# Altium footprint library 1.01-电阻.PcbLib: 78 footprints (part 4 of 5)
Each footprint in its own frame and in the unit in brackets; x right, y up, seen from the top. Pads: shape width x height; smd on the part's side, far side on the other; paste and mask are expansions set on the pad; w line width, h text height; cw(c..) or ccw(c..) is an arc to the next point about the centre after c.
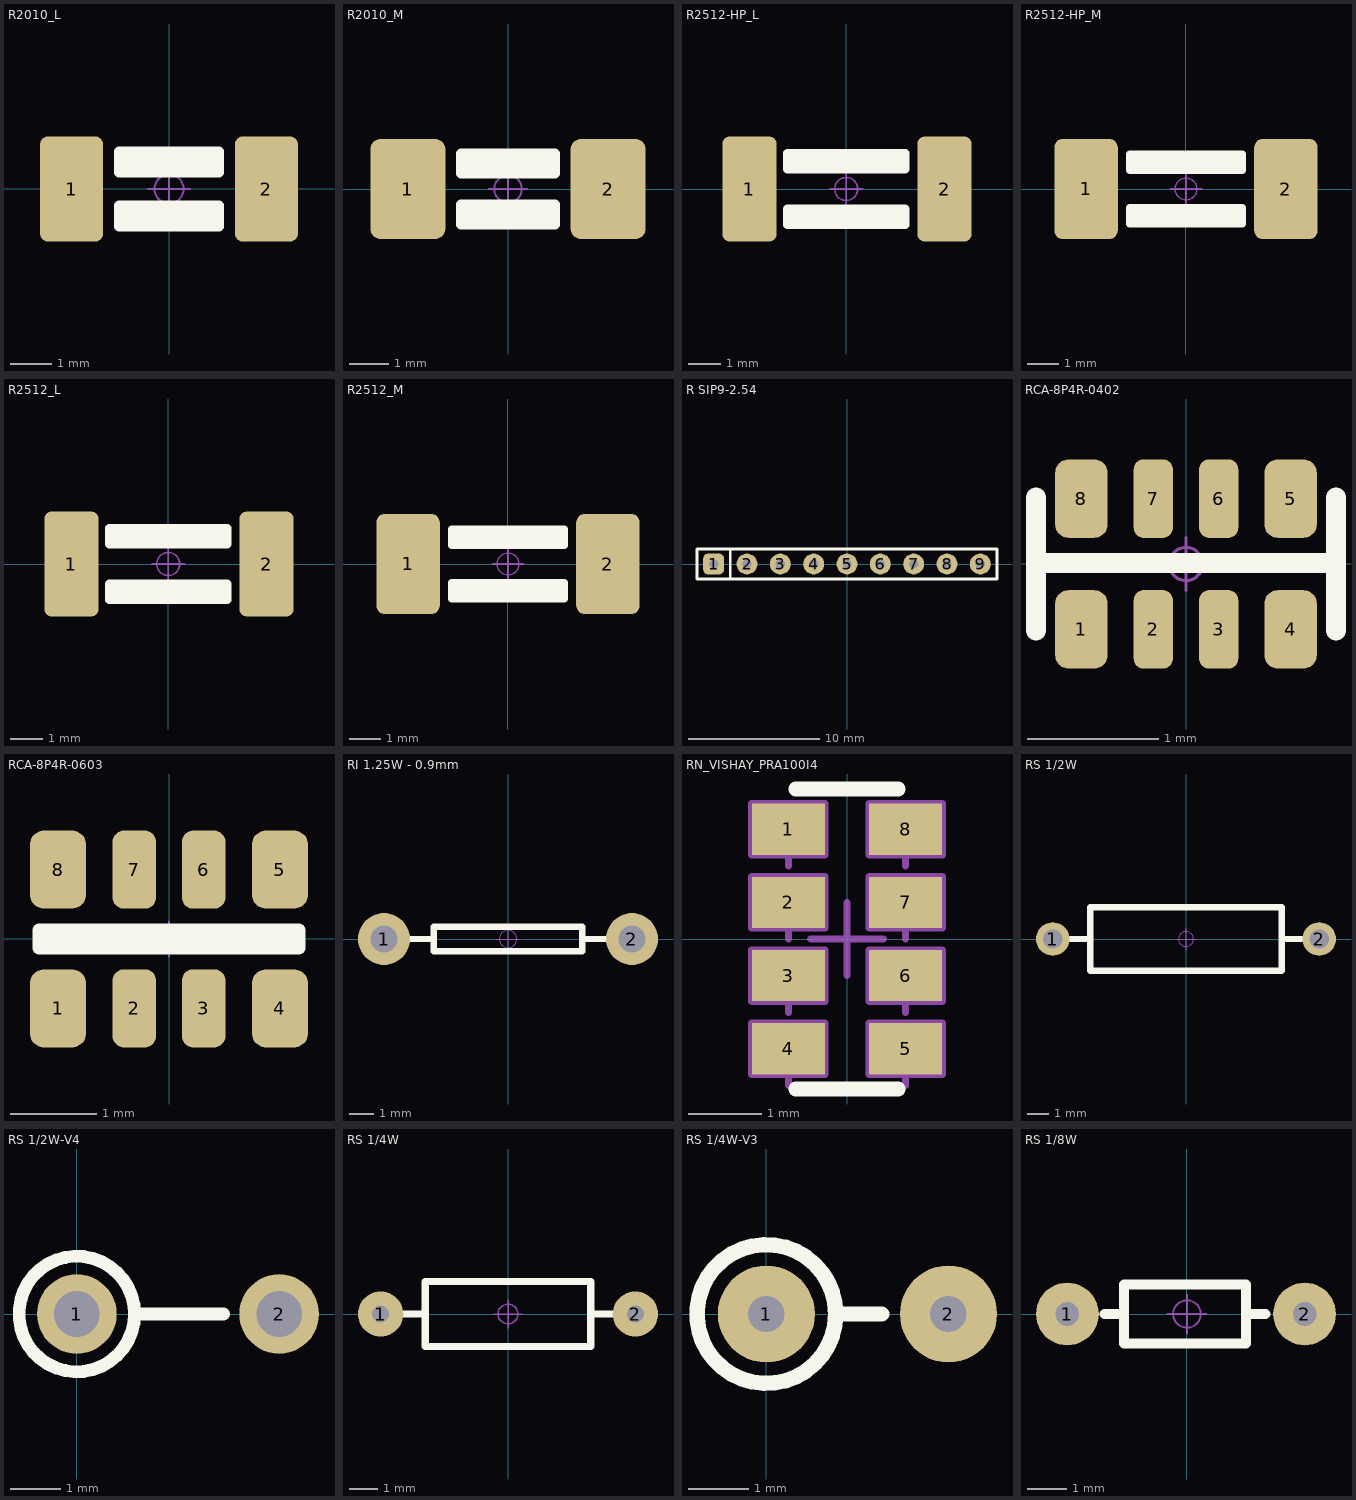
[diagram p3: the footprints below, top view; thin cyan lines are the x and y axes]

## R2010_L [mm] "3/4W贴片电阻                  淘宝ID:黄晶宝石"
pads (2):
  rrect25% 1.52x2.54 smd: 1(-2.35,0) 2(2.35,0)
Top Overlay:
  region: 1.2,-0.4 -1.2,-0.4 -1.2,-0.9 1.2,-0.9
  region: -1.2,0.4 1.2,0.4 1.2,0.9 -1.2,0.9
  lines w0.254: -1.2,-0.9 -1.2,-0.4 1.2,-0.4 1.2,-0.9 -0.7,-0.9 -1.2,-0.9 ; -1.2,0.4 -1.2,0.9 0.7,0.9 1.2,0.9 1.2,0.4 -1.2,0.4
Mechanical 15:
  circle w0.05: c0,0 r0.35
  lines w0.05: -0.5,0 0.5,0 ; 0,-0.5 0,0.5
3D body "R2010.STEP": height 0.58, standoff 0.03, extent -2.5,-1.25 2.5,1.25

## R2010_M [mm] "3/4W贴片电阻                 淘宝ID:黄晶宝石"
pads (2):
  rrect25% 1.905x2.54 smd: 1(-2.55,0) 2(2.55,0)
Top Overlay:
  region: 1.2,-0.4 -1.2,-0.4 -1.2,-0.9 1.2,-0.9
  region: -1.2,0.4 1.2,0.4 1.2,0.9 -1.2,0.9
  lines w0.254: -1.2,-0.9 -1.2,-0.4 1.2,-0.4 1.2,-0.9 -0.7,-0.9 -1.2,-0.9 ; -1.2,0.4 -1.2,0.9 0.7,0.9 1.2,0.9 1.2,0.4 -1.2,0.4
Mechanical 15:
  circle w0.05: c0,0 r0.35
  lines w0.05: -0.5,0 0.5,0 ; 0,-0.5 0,0.5
3D body "R2010.STEP": height 0.58, standoff 0.03, extent -2.5,-1.25 2.5,1.25

## R2512-HP_L [mm] "1W高精度贴片电阻                淘宝ID:黄晶宝石"
pads (2):
  rrect25% 1.65x3.2 smd: 1(-2.95,0) 2(3,0)
Top Overlay:
  region: 1.8,-0.6 1.8,-1.1 -1.8,-1.1 -1.8,-0.6
  region: -1.8,0.6 -1.8,1.1 1.8,1.1 1.8,0.6
  lines w0.254: -1.8,-1.1 -1.8,-0.6 1.8,-0.6 1.8,-1.1 -1.8,-1.1 ; -1.8,0.6 -1.8,1.1 1.8,1.1 1.8,0.6 -1.8,0.6
Mechanical 15:
  circle w0.05: c0,0 r0.35
  lines w0.05: -0.5,0 0.5,0 ; 0,-0.5 0,0.5
3D body "R2512-HP.STEP": height 0.58, standoff 0.03, extent -3.2,-1.6 3.2,1.6

## R2512-HP_M [mm] "1W高精度贴片电阻                  淘宝ID:黄晶宝石"
pads (2):
  rrect25% 2.032x3.2 smd: 1(-3.2,0) 2(3.2,0)
Top Overlay:
  region: 1.8,-0.6 1.8,-1.1 -1.8,-1.1 -1.8,-0.6
  region: -1.8,0.6 -1.8,1.1 1.8,1.1 1.8,0.6
  lines w0.254: -1.8,-1.1 -1.8,-0.6 1.8,-0.6 1.8,-1.1 -1.8,-1.1 ; -1.8,0.6 -1.8,1.1 1.8,1.1 1.8,0.6 -1.8,0.6
Mechanical 15:
  circle w0.05: c0,0 r0.35
  lines w0.05: -0.5,0 0.5,0 ; 0,-0.5 0,0.5
3D body "R2512-HP.STEP": height 0.58, standoff 0.03, extent -3.2,-1.6 3.2,1.6

## R2512_L [mm] "1W贴片电阻                淘宝ID:黄晶宝石"
pads (2):
  rrect25% 1.65x3.2 smd: 1(-2.95,0) 2(3,0)
Top Overlay:
  region: -1.8,0.6 -1.8,1.1 1.8,1.1 1.8,0.6
  region: 1.8,-0.6 1.8,-1.1 -1.8,-1.1 -1.8,-0.6
  lines w0.254: -1.8,-1.1 1.8,-1.1 1.8,-0.6 -1.8,-0.6 -1.8,-1.1 ; -1.8,0.6 1.8,0.6 1.8,1.1 -1.8,1.1 -1.8,0.6
Mechanical 15:
  circle w0.05: c0,0 r0.35
  lines w0.05: -0.5,0 0.5,0 ; 0,-0.5 0,0.5
3D body "R2512.STEP": height 0.58, standoff 0.03, extent -3.2,-1.6 3.2,1.6

## R2512_M [mm] "1W贴片电阻                 淘宝ID:黄晶宝石"
pads (2):
  rrect25% 2.032x3.2 smd: 1(-3.2,0) 2(3.2,0)
Top Overlay:
  region: -1.8,0.6 -1.8,1.1 1.8,1.1 1.8,0.6
  region: 1.8,-0.6 1.8,-1.1 -1.8,-1.1 -1.8,-0.6
  lines w0.254: -1.8,-1.1 1.8,-1.1 1.8,-0.6 -1.8,-0.6 -1.8,-1.1 ; -1.8,0.6 1.8,0.6 1.8,1.1 -1.8,1.1 -1.8,0.6
Mechanical 15:
  circle w0.05: c0,0 r0.35
  lines w0.05: -0.5,0 0.5,0 ; 0,-0.5 0,0.5
3D body "R2512.STEP": height 0.58, standoff 0.03, extent -3.2,-1.6 3.2,1.6

## R SIP9-2.54 [mm] "22.6mm*5mm*2.2mm(长*宽*厚)     淘宝ID:黄晶宝石"
pads (9):
  rrect50% 1.6x1.6 hole 0.7: 1(-10.16,0)
  round 1.6 hole 0.7: 2(-7.62,0) 3(-5.08,0) 4(-2.54,0) 5(0,0) 6(2.54,0) 7(5.08,0) 8(7.62,0) 9(10.16,0)
Top Overlay:
  lines w0.2: -8.9,-1.125 -8.9,1.125
  lines w0.203: -11.43,-1.143 -11.43,1.143 11.43,1.143 11.43,-1.143 -11.43,-1.143
Mechanical 15:
  circle w0.025: c0,0 r0.127
  lines w0.025: -0.2,0 0.2,0 ; 0,-0.2 0,0.2
3D body "r_sip9.STEP": height 5.2, standoff -3, extent -11.28,-0.983 11.331,0.933

## RCA-8P4R-0402 [mm] "2mm*1mm*0.45mm(长*宽*厚)             淘宝ID:黄晶宝石"
pads (8):
  rrect50% 0.4x0.6 smd: 1(-0.8,-0.5) 4(0.8,-0.5) 5(0.8,0.5) 8(-0.8,0.5)
  rrect50% 0.3x0.6 smd: 2(-0.25,-0.5) 3(0.25,-0.5) 6(0.25,0.5) 7(-0.25,0.5)
Top Overlay:
  lines w0.152: -1.147,-0.508 -1.147,0.508 ; -1.139,0.008 1.147,0.008 ; 1.147,-0.508 1.147,0.508
Mechanical 15:
  circle w0.025: c0,0 r0.127
  lines w0.025: -0.2,0 0.2,0 ; 0,-0.2 0,0.2
3D body "rca-8p4r-0402.STEP": height 0.48, standoff 0.03, extent -1,-0.5 1,0.5

## RCA-8P4R-0603 [mm] "3.2mm*1.6mm*0.6mm(长*宽*厚)             淘宝ID:黄晶宝石"
pads (8):
  rrect50% 0.65x0.9 smd: 1(-1.28,-0.8) 4(1.28,-0.8) 5(1.28,0.8) 8(-1.28,0.8)
  rrect50% 0.5x0.9 smd: 2(-0.4,-0.8) 3(0.4,-0.8) 6(0.4,0.8) 7(-0.4,0.8)
Top Overlay:
  region: -1.5,-0.1 1.5,-0.1 1.5,0.1 -1.5,0.1
  lines w0.152: -1.5,-0.1 1.5,-0.1 1.5,0.1 -1.5,0.1 -1.5,-0.1
Mechanical 15:
  circle w0.025: c0,0 r0.127
  lines w0.025: -0.2,0 0.2,0 ; 0,-0.2 0,0.2
3D body "rca-8p4r-0603.STEP": height 0.63, standoff 0.03, extent -1.6,-0.8 1.6,0.8

## RI 1.25W - 0.9mm [mm] "电流检测电阻，脚距10mm，高15mm，直径0.9mm"
pads (2):
  round 2.1 hole 1.1: 1(-5,0) 2(5,0)
Top Overlay:
  lines w0.254: -4,0 -3,0 ; 3,0 4,0 ; -3,-0.5 3,-0.5 3,0.5 -3,0.5 -3,-0.5
Mechanical 15:
  circle w0.05: c0,0 r0.35
  lines w0.05: -0.5,0 0.5,0 ; 0,-0.5 0,0.5
3D body "50mR-0.9mm.STEP": height 15.4, standoff -3.84, extent -6,-0.45 6,0.45

## RN_VISHAY_PRA100I4 [mm] "Resistor, Chip Array, Pitch 1mm, 8 Pin, 1.60mm W X 4mm L X 0.50mm H, Serie PRA100"
height 0.5
pads (8):
  rect 1x0.7 smd: 1(-0.8,1.5) 2(-0.8,0.5) 3(-0.8,-0.5) 4(-0.8,-1.5) 5(0.8,-1.5) 6(0.8,-0.5) 7(0.8,0.5) 8(0.8,1.5)
Top Overlay:
  lines w0.2: -0.7,-2.05 0.7,-2.05 ; -0.7,2.05 0.7,2.05
Mechanical 8:
  lines w0.1: -1.3,-1.5 -0.8,-1.5 ; -1.3,-0.5 -0.8,-0.5 ; -1.3,0.5 -0.8,0.5 ; -1.3,1.5 -0.8,1.5 ; -0.8,-2 -0.8,-1.5 ; -0.8,-1 -0.8,-0.5 ; -0.8,0 -0.8,0.5 ; -0.8,1 -0.8,1.5 ; -0.5,0 0,0 ; -0.3,-1.5 -0.8,-1.5 ; -0.3,-0.5 -0.8,-0.5 ; -0.3,0.5 -0.8,0.5 ; -0.3,1.5 -0.8,1.5 ; 0,-0.5 0,0 ; 0,0.5 0,0 ; 0.3,-1.5 0.8,-1.5 ; 0.3,-0.5 0.8,-0.5 ; 0.3,0.5 0.8,0.5 ; 0.3,1.5 0.8,1.5 ; 0.5,0 0,0 ; 0.8,-2 0.8,-1.5 ; 0.8,-1 0.8,-0.5 ; 0.8,0 0.8,0.5 ; 0.8,1 0.8,1.5 ; 1.3,-1.5 0.8,-1.5 ; 1.3,-0.5 0.8,-0.5 ; 1.3,0.5 0.8,0.5 ; 1.3,1.5 0.8,1.5 ; -1.3,-1.85 -0.3,-1.85 -0.3,-1.15 -1.3,-1.15 -1.3,-1.85 ; -1.3,-0.85 -0.3,-0.85 -0.3,-0.15 -1.3,-0.15 -1.3,-0.85 ; -1.3,0.15 -0.3,0.15 -0.3,0.85 -1.3,0.85 -1.3,0.15 ; -1.3,1.15 -0.3,1.15 -0.3,1.85 -1.3,1.85 -1.3,1.15 ; 0.3,-1.85 1.3,-1.85 1.3,-1.15 0.3,-1.15 0.3,-1.85 ; 0.3,-0.85 1.3,-0.85 1.3,-0.15 0.3,-0.15 0.3,-0.85 ; 0.3,0.15 1.3,0.15 1.3,0.85 0.3,0.85 0.3,0.15 ; 0.3,1.15 1.3,1.15 1.3,1.85 0.3,1.85 0.3,1.15
3D body "p100-070.stp": height 0.02, standoff 0, extent -1.3,-1.85 -0.3,-1.15
3D body "p100-070.stp": height 0.02, standoff 0, extent -1.3,-0.85 -0.3,-0.15
3D body "p100-070.stp": height 0.02, standoff 0, extent -1.3,0.15 -0.3,0.85
3D body "p100-070.stp": height 0.02, standoff 0, extent -1.3,1.15 -0.3,1.85
3D body "p100-070.stp": height 0.02, standoff 0, extent 0.3,1.15 1.3,1.85
3D body "p100-070.stp": height 0.02, standoff 0, extent 0.3,0.15 1.3,0.85
3D body "p100-070.stp": height 0.02, standoff 0, extent 0.3,-0.85 1.3,-0.15
3D body "p100-070.stp": height 0.02, standoff 0, extent 0.3,-1.85 1.3,-1.15
3D body "RN_VISHAY_PRA100I4.stp": height 0.53, standoff 0.03, extent -0.8,-2 0.8,2

## RS 1/2W [mm] "直插色环电阻，脚距12.5mm，直径3mm"
pads (2):
  round 1.575 hole 0.9: 1(-6.25,0) 2(6.25,0)
Top Overlay:
  lines w0.305: -5.5,0 -4.5,0 ; 4.5,0 5.5,0 ; -4.5,-1.5 4.5,-1.5 4.5,1.5 -4.5,1.5 -4.5,-1.5
Mechanical 15:
  circle w0.05: c0,0 r0.35
  lines w0.05: -0.5,0 0.5,0 ; 0,-0.5 0,0.5
3D body "rs_1-2w.STEP": height 3.11, standoff -3.4, extent -6.65,-1.585 6.35,1.435

## RS 1/2W-V4 [mil] "直插色环电阻，脚距4mm，直径3mm"
pads (2):
  round 62 hole 35.43: 1(0,0) 2(157.48,0)
Top Overlay:
  circle w10: c0,0 r45
  lines w10: 47.24,0 114.17,0
Mechanical 15:
  circle w1.97: c0,0 r13.78
  lines w1.97: -19.68,0 19.68,0 ; 0,-19.68 0,19.68
3D body "rs_1-2w-v4.STEP": height 428.12, standoff -132.8, extent -56.49,-60.43 170.28,58.47

## RS 1/4W [mm] "直插色环电阻，脚距9mm，直径2.3mm"
pads (2):
  round 1.6 hole 0.6: 1(-4.5,0) 2(4.5,0)
Top Overlay:
  lines w0.254: -3.683,0 -3.048,0 ; 3.048,0 3.683,0 ; -2.921,-1.143 -2.921,1.143 2.921,1.143 2.921,-1.143 -2.921,-1.143
Mechanical 15:
  circle w0.05: c0,0 r0.35
  lines w0.05: -0.5,0 0.5,0 ; 0,-0.5 0,0.5
3D body "rs_1-4w.STEP": height 2.32, standoff -3.49, extent -4.725,-1.16 4.725,1.16

## RS 1/4W-V3 [mm] "直插色环电阻，脚距3mm，直径2.3mm"
pads (2):
  round 1.6 hole 0.6: 1(0,0) 2(3,0)
Top Overlay:
  circle w0.254: c0,0 r1.143
  lines w0.254: 1.25,0 1.9,0
Mechanical 15:
  circle w0.05: c0,0 r0.35
  lines w0.05: -0.5,0 0.5,0 ; 0,-0.5 0,0.5
3D body "rs_1-4w-v3.STEP": height 7.55, standoff -3.37, extent -1.06,-1.11 3.325,1.21

## RS 1/8W [mm] "直插色环电阻，脚距6mm，直径1.5mm"
pads (2):
  round 1.6 hole 0.6: 1(-3.048,0) 2(3,0)
Top Overlay:
  lines w0.254: -2.1,0 -1.6,0 ; 2,0 1.5,0 ; -1.6,0 -1.6,0.75 1.5,0.75 1.5,0 ; -1.6,0 -1.6,-0.75 1.5,-0.75 1.5,0
Mechanical 15:
  circle w0.05: c0,0 r0.35
  lines w0.05: -0.5,0 0.5,0 ; 0,-0.5 0,0.5
3D body "rs_1-8w.STEP": height 1.57, standoff -3.44, extent -3.225,-0.757 3.225,0.757